# Altium footprint library FujinLib.PcbLib: 106 footprints (part 1 of 7)
Each footprint in its own frame and in the unit in brackets; x right, y up, seen from the top. Pads: shape width x height; smd on the part's side, far side on the other; paste and mask are expansions set on the pad; w line width, h text height; cw(c..) or ccw(c..) is an arc to the next point about the centre after c.
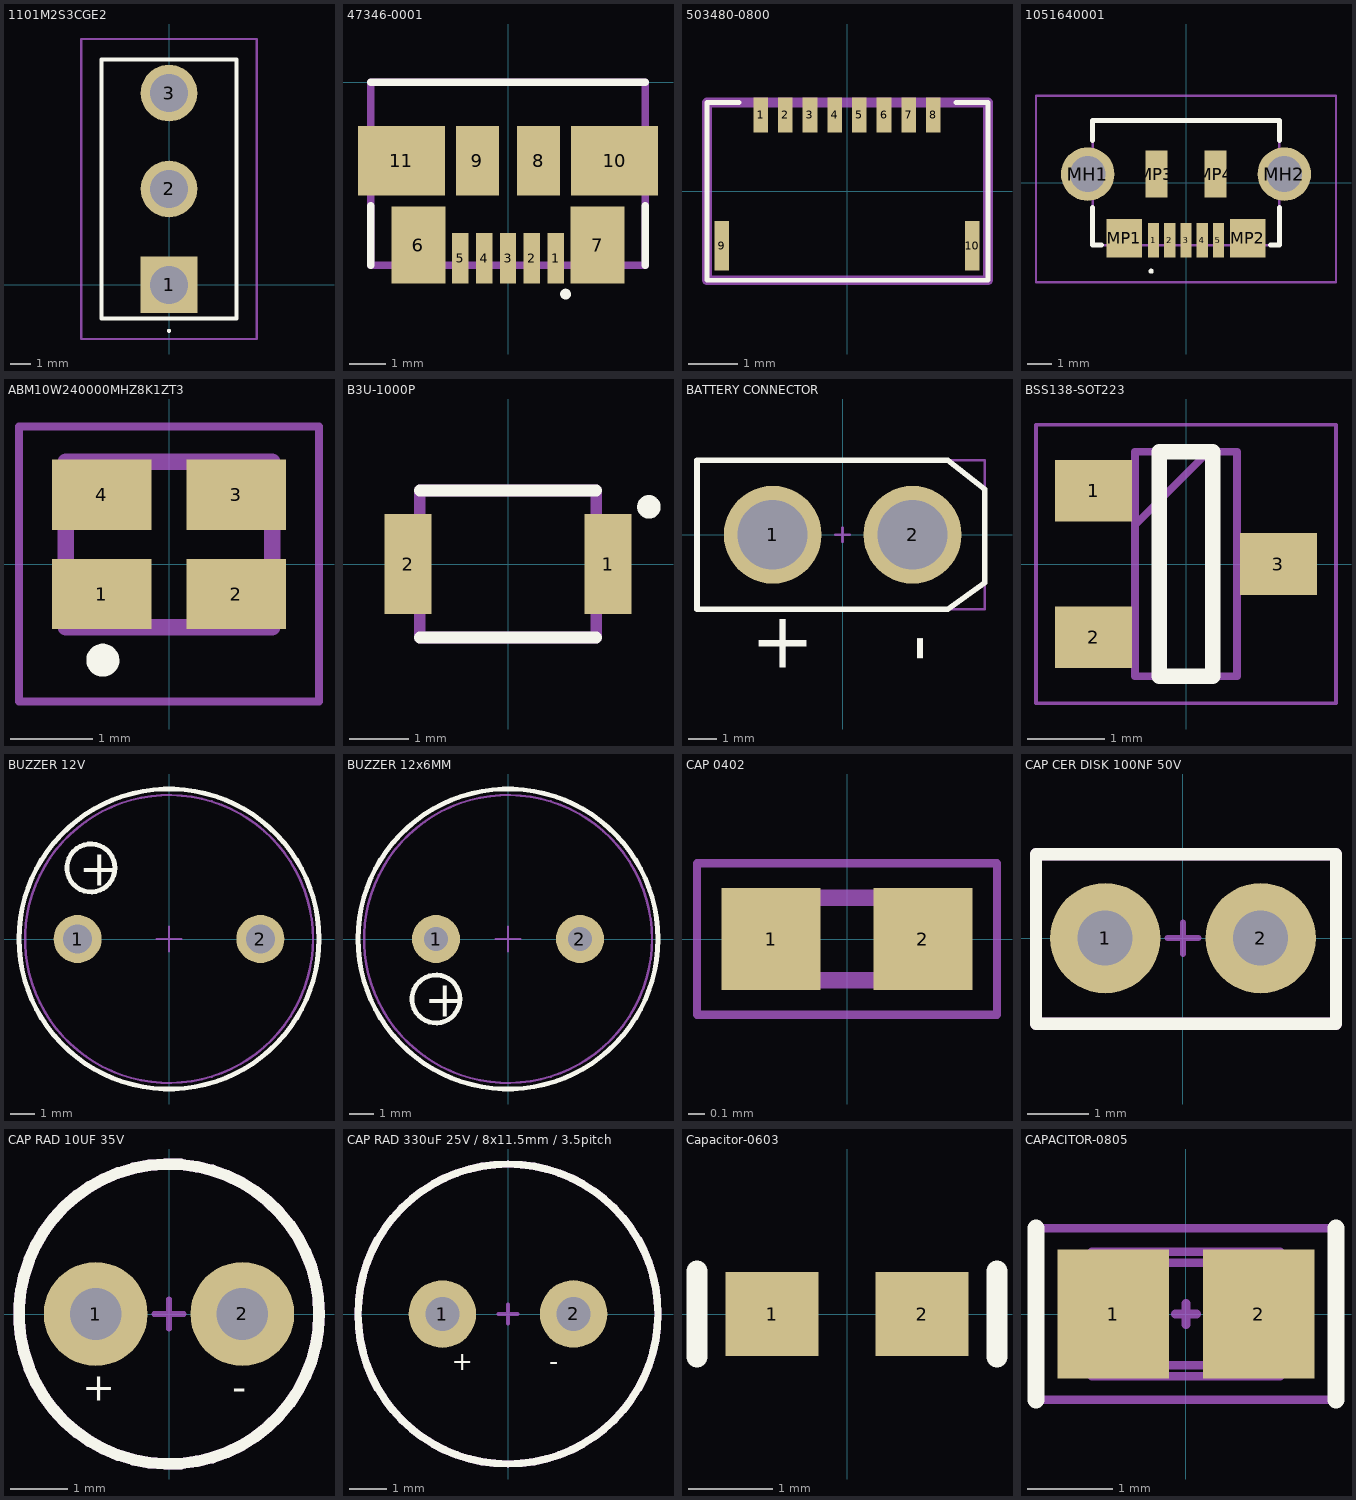
[diagram p0: the footprints below, top view; thin cyan lines are the x and y axes]

## 1101M2S3CGE2 [mm]
pads (3):
  rect 2.775x2.775 hole 1.85: 1(0,0)
  round 2.775 hole 1.85: 2(0,4.7) 3(0,9.4)
Top Overlay:
  lines w0.1: 0,-2.3 cw(c0,-2.25) 0,-2.2 cw(c0,-2.25) 0,-2.3
  lines w0.2: -3.3,-1.65 3.3,-1.65 3.3,11.05 -3.3,11.05 -3.3,-1.65
Mechanical 13:
  lines w0.1: -3.3,-1.65 3.3,-1.65 3.3,11.05 -3.3,11.05 -3.3,-1.65
Mechanical 15:
  lines w0.1: -4.3,-2.65 4.3,-2.65 4.3,12.05 -4.3,12.05 -4.3,-2.65
3D body "1101M2S3CGE2.stp": height 12.47, standoff -3.81, extent -3.354,-1.6 3.354,11.1

## 47346-0001 [mm]
pads (11):
  rect 0.45x1.38 smd: 1(1.3,-4.81) 2(0.65,-4.81) 3(0,-4.81) 4(-0.65,-4.81) 5(-1.3,-4.81)
  rect 1.475x2.1 smd: 6(-2.452,-4.45) 7(2.452,-4.45)
  rect 1.175x1.9 smd: 8(0.837,-2.15) 9(-0.837,-2.15)
  rect 2.375x1.9 smd: 10(2.913,-2.15) 11(-2.913,-2.15)
Top Overlay:
  circle w0.2: c1.572,-5.79 r0.046
  lines w0.2: -3.75,-5 -3.75,-3.373 ; -3.75,0 3.75,0 ; 3.75,-5 3.75,-3.373
Mechanical 13:
  lines w0.2: -3.75,-5 3.75,-5 3.75,0 -3.75,0 -3.75,-5
3D body "47346-0001.stp": height 2.7, standoff -0.24, extent -3.99,-5.38 3.99,0.05

## 503480-0800 [mm]
pads (10):
  rect 0.3x0.7 smd: 1(-1.76,1.55) 2(-1.26,1.55) 3(-0.76,1.55) 4(-0.26,1.55) 5(0.24,1.55) 6(0.74,1.55) 7(1.24,1.55) 8(1.74,1.55)
  rect 0.3x1 smd: 9(-2.55,-1.1) 10(2.53,-1.1)
Top Overlay:
  lines w0.1: -2.2,1.8 -2.85,1.8 -2.85,-1.8 2.85,-1.8 2.85,1.8 2.2,1.8
Mechanical 13:
  lines w0.2: -2.85,-1.8 2.85,-1.8 2.85,1.8 -2.85,1.8 -2.85,-1.8
3D body "503480-0800.stp": height 1.87, standoff 0, extent -2.85,-1.8 2.85,1.8

## 1051640001 [mm]
pads (11):
  rect 0.45x1.38 smd: 1(-1.3,-2.31) 2(-0.65,-2.31) 3(0,-2.31) 4(0.65,-2.31) 5(1.3,-2.31)
  round 2.145 hole 1.43: MH1(-3.95,0.35) MH2(3.95,0.35)
  rect 1.425x1.55 smd: MP1(-2.487,-2.225) MP2(2.487,-2.225)
  rect 0.875x1.9 smd: MP3(-1.188,0.35) MP4(1.188,0.35)
Top Overlay:
  lines w0.1: -1.4,-3.6 cw(c-1.4,-3.55) -1.4,-3.5 cw(c-1.4,-3.55) -1.4,-3.6
  lines w0.2: -3.75,-1 -3.75,-2.5 -3.4,-2.5 ; -3.75,1.7 -3.75,2.5 3.75,2.5 3.75,1.7 ; 3.4,-2.5 3.75,-2.5 3.75,-1
Mechanical 13:
  lines w0.1: -3.75,-2.5 -3.75,2.5 3.75,2.5 3.75,-2.5 -3.75,-2.5
Mechanical 15:
  lines w0.1: -6.022,-4 -6.022,3.5 6.022,3.5 6.022,-4 -6.022,-4
3D body "105164-0001.stp": height 2.56, standoff -0.69, extent -4.1,-2.82 4.1,2.33

## ABM10W240000MHZ8K1ZT3 [mm]
pads (4):
  rect 1.2x0.85 smd: 1(-0.813,-0.363) 2(0.813,-0.363) 3(0.813,0.837) 4(-0.813,0.837)
Top Overlay:
  lines w0.2: -0.701,-1.162 ccw(c-0.8,-1.162) -0.9,-1.162 ccw(c-0.8,-1.162) -0.699,-1.162
Mechanical 13:
  lines w0.2: -1.25,-0.763 -1.25,1.238 1.25,1.238 1.25,-0.763 -1.25,-0.763
Mechanical 15:
  lines w0.1: -1.813,-1.662 -1.813,1.662 1.813,1.662 1.813,-1.662 -1.813,-1.662
3D body "ABM10W-16.0000MHZ-4-B1U-T3.stp": height 0.7, standoff 0, extent -1.328,-0.763 1.328,1.238

## B3U-1000P [mm]
pads (2):
  rect 0.8x1.7 smd: 1(1.7,0) 2(-1.7,0)
Top Overlay:
  circle w0.2: c2.395,0.971 r0.1
  lines w0.2: -1.5,-1.25 1.5,-1.25 ; -1.5,1.25 1.5,1.25
Mechanical 13:
  lines w0.2: -1.5,-1.25 -1.5,1.25 1.5,1.25 1.5,-1.25 -1.5,-1.25
3D body "b3u-1000p.stp": height 1.6, standoff 0, extent -2,-1.25 2,1.25

## BATTERY CONNECTOR [mm] "XT60 MALE"
height 16.2
pads (2):
  round 3.5 hole 2.5: 1(-2.5,0) 2(2.5,0)
Top Overlay:
  lines w0.2: -5.207,-2.667 -5.207,2.667 3.763,2.667 5.08,1.633 5.08,-1.715 3.763,-2.667 -5.207,-2.667
  text "+" at -3.283,-4.759 h2
  text "-" at 3.521,-4.553 h2
Mechanical 13:
  lines w0.1: -5.207,-2.667 -5.207,2.667 3.765,2.667 5.08,1.632 5.08,-1.686 3.834,-2.667 -5.207,-2.667
Mechanical 15:
  lines w0.1: -0.25,0 0.25,0 ; 0,-0.25 0,0.25 ; -5.207,-2.667 -5.207,-1.016 -5.207,1.778 -5.207,2.667 5.08,2.667 5.08,-2.667 -5.207,-2.667
Mechanical 29:
  text ".Designator" at 0,0 h1

## BSS138-SOT223 [mm]
pads (3):
  rect 1x0.8 smd: 1(-1.2,0.95) 2(-1.2,-0.95) 3(1.2,0)
Top Overlay:
  lines w0.2: -0.35,-1.46 0.35,-1.46 0.35,1.46 -0.35,1.46 -0.35,-1.46
Mechanical 13:
  lines w0.1: -0.662,0.51 0.288,1.46 ; -0.662,-1.46 0.662,-1.46 0.662,1.46 -0.662,1.46 -0.662,-1.46
Mechanical 15:
  lines w0.05: -1.95,-1.81 1.95,-1.81 1.95,1.81 -1.95,1.81 -1.95,-1.81
3D body "BSS138.stp": height 1.2, standoff 0, extent -1.2,-1.46 1.2,1.46

## BUZZER 12V [mm] "BUZZER 12v 7.62mm"
height 6.33
pads (2):
  round 2 hole 1.2: 1(-3.81,0) 2(3.81,0)
Top Overlay:
  circle w0.2: c0,0 r6.25
  circle w0.2: c-3.254,2.961 r1
  text "+" at -3.754,2.211 h1.5
Mechanical 13:
  circle w0.1: c0,0 r6
Mechanical 15:
  circle w0.1: c0,0 r6.25
  lines w0.1: -0.508,0 0.508,0 ; 0,-0.508 0,0.508
3D body "Buzzer.STEP": height 6.33, standoff -2, extent -6,-6 6,6

## BUZZER 12x6MM [mm] "BUZZER 12x6MM"
height 6.33
pads (2):
  round 2 hole 1: 1(-3,0) 2(3,0)
Top Overlay:
  circle w0.2: c-3,-2.5 r1
  circle w0.2: c0,0 r6.25
  text "+" at -3.5,-3.25 h1.5
Mechanical 13:
  circle w0.1: c0,0 r6
Mechanical 15:
  circle w0.1: c0,0 r6.25
  lines w0.1: -0.508,0 0.508,0 ; 0,-0.508 0,0.508
3D body "Buzzer.STEP": height 6.33, standoff -2, extent -6,-6 6,6

## CAP 0402 [mm]
pads (2):
  rect 0.6x0.62 smd: 1(-0.46,0) 2(0.46,0)
Mechanical 13:
  lines w0.1: -0.5,-0.25 0.5,-0.25 0.5,0.25 -0.5,0.25 -0.5,-0.25
Mechanical 15:
  lines w0.05: -0.91,-0.46 0.91,-0.46 0.91,0.46 -0.91,0.46 -0.91,-0.46
3D body "GJM1555C1H200JB01D.stp": height 0.55, standoff 0, extent -0.5,-0.25 0.5,0.25

## CAP CER DISK 100NF 50V [mm] "Connector; Header; 5 Position"
pads (2):
  round 1.8 hole 0.9: 1(-1.27,0) 2(1.27,0)
Top Overlay:
  lines w0.2: -2.4,-1.397 -2.4,1.37 2.5,1.37 2.5,-1.397 -2.4,-1.397
Mechanical 15:
  lines w0.1: -0.254,0 0.254,0 ; 0,-0.254 0,0.254
  lines w0.2: -2.4,-1.397 2.5,-1.397 2.5,1.37 -2.4,1.37 -2.4,-1.397
Mechanical 29:
  text "1" at -0.4,-1.1 h0.5
3D body "CAP_Ceramic.STEP": height 6.1, standoff -3.93, extent -2.28,-1.25 2.42,1.25

## CAP RAD 10UF 35V [mm]
pads (2):
  round 1.8 hole 0.9: 1(-1.27,0) 2(1.27,0)
Top Overlay:
  circle w0.2: c0,0 r2.6
  text "-" at 1.1,-1.5 h0.5
  text "+" at -1.5,-1.5 h0.5
Mechanical 15:
  circle w0.2: c0,0 r2.6
  lines w0.1: -0.254,0 0.254,0 ; 0,-0.254 0,0.254
Mechanical 29:
  text "-" at 1.1,-1.5 h0.5
  text "+" at -1.5,-1.5 h0.5
3D body "CAP ELE PTH.STEP": height 12.2, standoff -1.7, extent -2.5,-2.5 2.5,2.5

## CAP RAD 330uF 25V / 8x11.5mm / 3.5pitch [mm]
pads (2):
  round 1.8 hole 0.9: 1(-1.75,0) 2(1.75,0)
Top Overlay:
  circle w0.2: c0,0 r4
  text "-" at 1.1,-1.5 h0.5
  text "+" at -1.5,-1.5 h0.5
Mechanical 15:
  circle w0.2: c0,0 r4
  lines w0.1: -0.254,0 0.254,0 ; 0,-0.254 0,0.254
Mechanical 29:
  text "-" at 1.1,-1.5 h0.5
  text "+" at -1.5,-1.5 h0.5
3D body "User Library-Capacitor Radial Electrolitic.step": height 11.51, standoff -2.7, extent -4,-4 4.01,4

## Capacitor-0603 [mm] "Chip Capacitor; Body 1.6 x 0.8 mm (LxW typ)"
height 0.87
pads (2):
  rect 1.1x1 smd: 1(-0.889,0) 2(0.889,0)
Top Overlay:
  lines w0.254: -1.778,-0.508 -1.778,0.508 ; 1.778,-0.508 1.778,0.508
3D body "cap0603.STEP": height 0.89, standoff -0.01, extent -1.27,-0.508 1.33,0.492

## CAPACITOR-0805 [mm] "Chip, Body 2.0x1.3mm, IPC Medium Density"
height 1.1
pads (2):
  rect 1.3x1.5 smd: 1(-0.85,0) 2(0.85,0)
Top Overlay:
  lines w0.2: -1.75,-1 -1.75,1 ; 1.75,-1 1.75,1
Mechanical 13:
  lines w0.1: -1,-0.6 -1,0.6 1,0.6 1,-0.6 -1,-0.6
Mechanical 15:
  lines w0.1: -0.127,0 0.127,0 ; 0,-0.127 0,0.127 ; -1.75,-1 1.75,-1 1.75,1 -1.75,1 -1.75,-1
Mechanical 29:
  lines w0.1: -1.1,-0.725 1.1,-0.725 1.1,0.725 -1.1,0.725 -1.1,-0.725
  text ".Designator" at -1.27,-0.508 h1
3D body: height 1.2, standoff 0, extent -1,-0.6 1,0.6